# Altium footprint library Connector_Samtec_HLE_SMD.PcbLib: 290 footprints (part 6 of 24)
Each footprint in its own frame and in the unit in brackets; x right, y up, seen from the top. Pads: shape width x height; smd on the part's side, far side on the other; paste and mask are expansions set on the pad; w line width, h text height; cw(c..) or ccw(c..) is an arc to the next point about the centre after c.
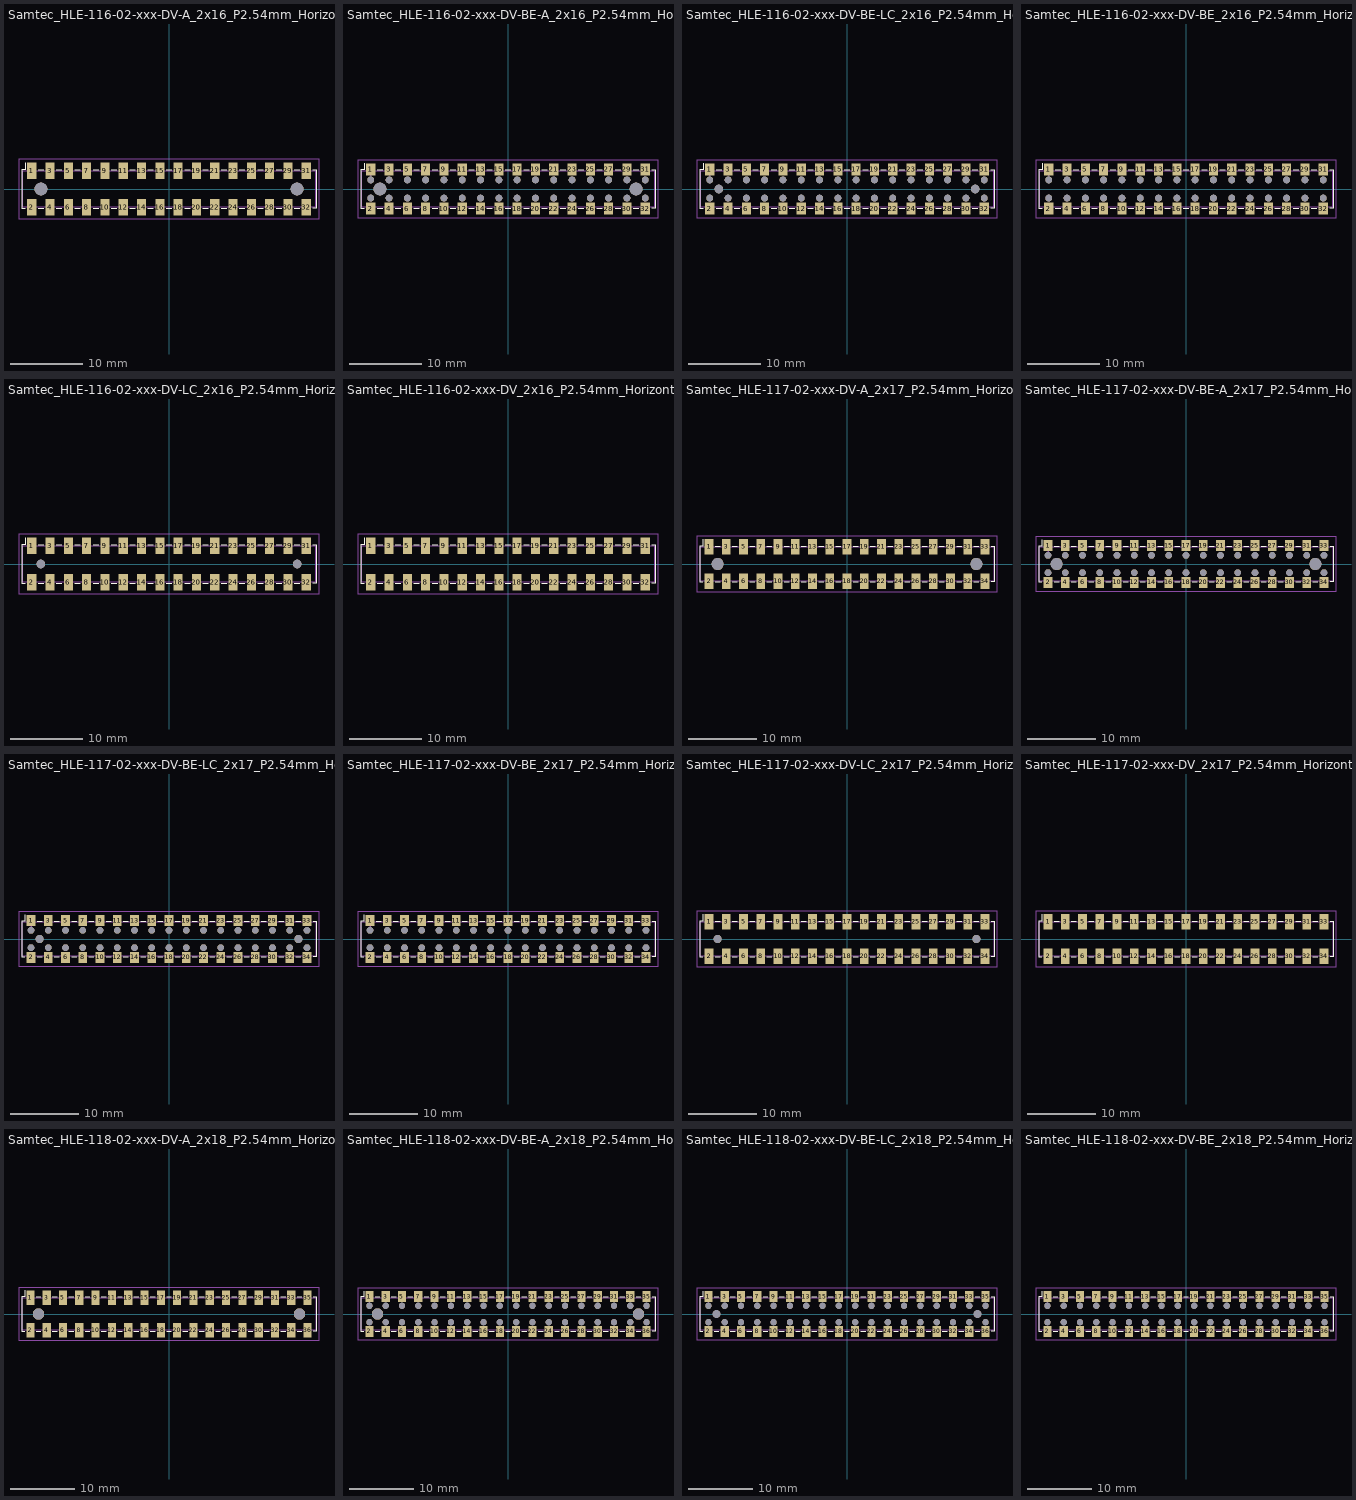
[diagram p5: the footprints below, top view; thin cyan lines are the x and y axes]

## Samtec_HLE-116-02-xxx-DV-A_2x16_P2.54mm_Horizontal [mm]
pads (34):
  rect 1.27x2.29 smd: 1(-19.05,2.525) 2(-19.05,-2.525) 3(-16.51,2.525) 4(-16.51,-2.525) 5(-13.97,2.525) 6(-13.97,-2.525) 7(-11.43,2.525) 8(-11.43,-2.525) 9(-8.89,2.525) 10(-8.89,-2.525) 11(-6.35,2.525) 12(-6.35,-2.525) 13(-3.81,2.525) 14(-3.81,-2.525) 15(-1.27,2.525) 16(-1.27,-2.525) 17(1.27,2.525) 18(1.27,-2.525) 19(3.81,2.525) 20(3.81,-2.525) 21(6.35,2.525) 22(6.35,-2.525) 23(8.89,2.525) 24(8.89,-2.525) 25(11.43,2.525) 26(11.43,-2.525) 27(13.97,2.525) 28(13.97,-2.525) 29(16.51,2.525) 30(16.51,-2.525) 31(19.05,2.525) 32(19.05,-2.525)
  round 1.78 hole 1.78: Un1(-17.78,0) Un2(17.78,0)
F.SilkS:
  lines w0.12: -19.945,-2.65 -20.43,-2.65 -20.43,2.65 -19.945,2.65 -19.945,3.67 ; -18.155,-2.65 -17.405,-2.65 ; -18.155,2.65 -17.405,2.65 ; -15.615,-2.65 -14.865,-2.65 ; -15.615,2.65 -14.865,2.65 ; -13.075,-2.65 -12.325,-2.65 ; -13.075,2.65 -12.325,2.65 ; -10.535,-2.65 -9.785,-2.65 ; -10.535,2.65 -9.785,2.65 ; -7.995,-2.65 -7.245,-2.65 ; -7.995,2.65 -7.245,2.65 ; -5.455,-2.65 -4.705,-2.65 ; -5.455,2.65 -4.705,2.65 ; -2.915,-2.65 -2.165,-2.65 ; -2.915,2.65 -2.165,2.65 ; -0.375,-2.65 0.375,-2.65 ; -0.375,2.65 0.375,2.65 ; 2.165,-2.65 2.915,-2.65 ; 2.165,2.65 2.915,2.65 ; 4.705,-2.65 5.455,-2.65 ; 4.705,2.65 5.455,2.65 ; 7.245,-2.65 7.995,-2.65 ; 7.245,2.65 7.995,2.65 ; 9.785,-2.65 10.535,-2.65 ; 9.785,2.65 10.535,2.65 ; 12.325,-2.65 13.075,-2.65 ; 12.325,2.65 13.075,2.65 ; 14.865,-2.65 15.615,-2.65 ; 14.865,2.65 15.615,2.65 ; 17.405,-2.65 18.155,-2.65 ; 17.405,2.65 18.155,2.65 ; 19.945,-2.65 20.43,-2.65 20.43,2.65 19.945,2.65
F.CrtYd:
  lines w0.05: -20.82,-4.17 20.82,-4.17 20.82,4.17 -20.82,4.17 -20.82,-4.17
F.Fab:
  lines w0.1: -19.55,2.54 -19.05,1.833 -18.55,2.54 ; -20.32,-2.54 -20.32,2.54 20.32,2.54 20.32,-2.54 -20.32,-2.54
  text "'.Designator'" at -4.047,-2.68 h1

## Samtec_HLE-116-02-xxx-DV-BE-A_2x16_P2.54mm_Horizontal [mm]
pads (66):
  rect 1.27x1.68 smd: 1(-19.05,2.72) 2(-19.05,-2.72) 3(-16.51,2.72) 4(-16.51,-2.72) 5(-13.97,2.72) 6(-13.97,-2.72) 7(-11.43,2.72) 8(-11.43,-2.72) 9(-8.89,2.72) 10(-8.89,-2.72) 11(-6.35,2.72) 12(-6.35,-2.72) 13(-3.81,2.72) 14(-3.81,-2.72) 15(-1.27,2.72) 16(-1.27,-2.72) 17(1.27,2.72) 18(1.27,-2.72) 19(3.81,2.72) 20(3.81,-2.72) 21(6.35,2.72) 22(6.35,-2.72) 23(8.89,2.72) 24(8.89,-2.72) 25(11.43,2.72) 26(11.43,-2.72) 27(13.97,2.72) 28(13.97,-2.72) 29(16.51,2.72) 30(16.51,-2.72) 31(19.05,2.72) 32(19.05,-2.72)
  round 0.97 hole 0.97: Un1(11.43,-1.27) Un3(13.97,1.27) Un4(1.27,-1.27) Un5(6.35,1.27) Un7(-1.27,-1.27) Un8(3.81,1.27) Un9(-1.27,1.27) Un10(16.51,-1.27) Un11(-19.05,1.27) Un12(3.81,-1.27) Un13(6.35,-1.27) Un14(-3.81,-1.27) Un15(-16.51,1.27) Un16(-11.43,1.27) Un17(-19.05,-1.27) Un18(1.27,1.27) Un19(19.05,1.27) Un20(-6.35,-1.27) Un21(8.89,-1.27) Un22(11.43,1.27) Un23(-8.89,1.27) Un24(-3.81,1.27) Un25(-6.35,1.27) Un26(-16.51,-1.27) Un27(-11.43,-1.27) Un28(-13.97,-1.27) Un29(-13.97,1.27) Un30(8.89,1.27) Un31(13.97,-1.27) Un32(19.05,-1.27) Un33(16.51,1.27) Un34(-8.89,-1.27)
  round 1.78 hole 1.78: Un2(-17.78,0) Un6(17.78,0)
F.SilkS:
  lines w0.12: -19.945,-2.65 -20.43,-2.65 -20.43,2.65 -19.945,2.65 -19.945,3.56 ; -18.155,-2.65 -17.405,-2.65 ; -18.155,2.65 -17.405,2.65 ; -15.615,-2.65 -14.865,-2.65 ; -15.615,2.65 -14.865,2.65 ; -13.075,-2.65 -12.325,-2.65 ; -13.075,2.65 -12.325,2.65 ; -10.535,-2.65 -9.785,-2.65 ; -10.535,2.65 -9.785,2.65 ; -7.995,-2.65 -7.245,-2.65 ; -7.995,2.65 -7.245,2.65 ; -5.455,-2.65 -4.705,-2.65 ; -5.455,2.65 -4.705,2.65 ; -2.915,-2.65 -2.165,-2.65 ; -2.915,2.65 -2.165,2.65 ; -0.375,-2.65 0.375,-2.65 ; -0.375,2.65 0.375,2.65 ; 2.165,-2.65 2.915,-2.65 ; 2.165,2.65 2.915,2.65 ; 4.705,-2.65 5.455,-2.65 ; 4.705,2.65 5.455,2.65 ; 7.245,-2.65 7.995,-2.65 ; 7.245,2.65 7.995,2.65 ; 9.785,-2.65 10.535,-2.65 ; 9.785,2.65 10.535,2.65 ; 12.325,-2.65 13.075,-2.65 ; 12.325,2.65 13.075,2.65 ; 14.865,-2.65 15.615,-2.65 ; 14.865,2.65 15.615,2.65 ; 17.405,-2.65 18.155,-2.65 ; 17.405,2.65 18.155,2.65 ; 19.945,-2.65 20.43,-2.65 20.43,2.65 19.945,2.65
F.CrtYd:
  lines w0.05: -20.82,-4.06 20.82,-4.06 20.82,4.06 -20.82,4.06 -20.82,-4.06
F.Fab:
  lines w0.1: -19.55,2.54 -19.05,1.833 -18.55,2.54 ; -20.32,-2.54 -20.32,2.54 20.32,2.54 20.32,-2.54 -20.32,-2.54
  text "'.Designator'" at -4.047,-2.68 h1

## Samtec_HLE-116-02-xxx-DV-BE-LC_2x16_P2.54mm_Horizontal [mm]
pads (66):
  rect 1.27x1.68 smd: 1(-19.05,2.72) 2(-19.05,-2.72) 3(-16.51,2.72) 4(-16.51,-2.72) 5(-13.97,2.72) 6(-13.97,-2.72) 7(-11.43,2.72) 8(-11.43,-2.72) 9(-8.89,2.72) 10(-8.89,-2.72) 11(-6.35,2.72) 12(-6.35,-2.72) 13(-3.81,2.72) 14(-3.81,-2.72) 15(-1.27,2.72) 16(-1.27,-2.72) 17(1.27,2.72) 18(1.27,-2.72) 19(3.81,2.72) 20(3.81,-2.72) 21(6.35,2.72) 22(6.35,-2.72) 23(8.89,2.72) 24(8.89,-2.72) 25(11.43,2.72) 26(11.43,-2.72) 27(13.97,2.72) 28(13.97,-2.72) 29(16.51,2.72) 30(16.51,-2.72) 31(19.05,2.72) 32(19.05,-2.72)
  round 0.97 hole 0.97: Un1(-1.27,-1.27) Un2(-3.81,-1.27) Un3(16.51,-1.27) Un4(6.35,-1.27) Un5(-8.89,-1.27) Un6(13.97,1.27) Un7(6.35,1.27) Un8(11.43,1.27) Un10(1.27,-1.27) Un11(1.27,1.27) Un12(8.89,-1.27) Un13(16.51,1.27) Un14(-19.05,1.27) Un15(-6.35,1.27) Un16(11.43,-1.27) Un17(13.97,-1.27) Un18(3.81,1.27) Un19(-16.51,-1.27) Un20(-13.97,-1.27) Un21(-16.51,1.27) Un22(8.89,1.27) Un23(19.05,1.27) Un24(-8.89,1.27) Un25(-11.43,1.27) Un26(-6.35,-1.27) Un27(-1.27,1.27) Un28(3.81,-1.27) Un30(19.05,-1.27) Un31(-11.43,-1.27) Un32(-13.97,1.27) Un33(-3.81,1.27) Un34(-19.05,-1.27)
  round 1.19 hole 1.19: Un9(-17.78,0) Un29(17.78,0)
F.SilkS:
  lines w0.12: -19.945,-2.65 -20.43,-2.65 -20.43,2.65 -19.945,2.65 -19.945,3.56 ; -18.155,-2.65 -17.405,-2.65 ; -18.155,2.65 -17.405,2.65 ; -15.615,-2.65 -14.865,-2.65 ; -15.615,2.65 -14.865,2.65 ; -13.075,-2.65 -12.325,-2.65 ; -13.075,2.65 -12.325,2.65 ; -10.535,-2.65 -9.785,-2.65 ; -10.535,2.65 -9.785,2.65 ; -7.995,-2.65 -7.245,-2.65 ; -7.995,2.65 -7.245,2.65 ; -5.455,-2.65 -4.705,-2.65 ; -5.455,2.65 -4.705,2.65 ; -2.915,-2.65 -2.165,-2.65 ; -2.915,2.65 -2.165,2.65 ; -0.375,-2.65 0.375,-2.65 ; -0.375,2.65 0.375,2.65 ; 2.165,-2.65 2.915,-2.65 ; 2.165,2.65 2.915,2.65 ; 4.705,-2.65 5.455,-2.65 ; 4.705,2.65 5.455,2.65 ; 7.245,-2.65 7.995,-2.65 ; 7.245,2.65 7.995,2.65 ; 9.785,-2.65 10.535,-2.65 ; 9.785,2.65 10.535,2.65 ; 12.325,-2.65 13.075,-2.65 ; 12.325,2.65 13.075,2.65 ; 14.865,-2.65 15.615,-2.65 ; 14.865,2.65 15.615,2.65 ; 17.405,-2.65 18.155,-2.65 ; 17.405,2.65 18.155,2.65 ; 19.945,-2.65 20.43,-2.65 20.43,2.65 19.945,2.65
F.CrtYd:
  lines w0.05: -20.82,-4.06 20.82,-4.06 20.82,4.06 -20.82,4.06 -20.82,-4.06
F.Fab:
  lines w0.1: -19.55,2.54 -19.05,1.833 -18.55,2.54 ; -20.32,-2.54 -20.32,2.54 20.32,2.54 20.32,-2.54 -20.32,-2.54
  text "'.Designator'" at -4.047,-2.68 h1

## Samtec_HLE-116-02-xxx-DV-BE_2x16_P2.54mm_Horizontal [mm]
pads (64):
  rect 1.27x1.68 smd: 1(-19.05,2.72) 2(-19.05,-2.72) 3(-16.51,2.72) 4(-16.51,-2.72) 5(-13.97,2.72) 6(-13.97,-2.72) 7(-11.43,2.72) 8(-11.43,-2.72) 9(-8.89,2.72) 10(-8.89,-2.72) 11(-6.35,2.72) 12(-6.35,-2.72) 13(-3.81,2.72) 14(-3.81,-2.72) 15(-1.27,2.72) 16(-1.27,-2.72) 17(1.27,2.72) 18(1.27,-2.72) 19(3.81,2.72) 20(3.81,-2.72) 21(6.35,2.72) 22(6.35,-2.72) 23(8.89,2.72) 24(8.89,-2.72) 25(11.43,2.72) 26(11.43,-2.72) 27(13.97,2.72) 28(13.97,-2.72) 29(16.51,2.72) 30(16.51,-2.72) 31(19.05,2.72) 32(19.05,-2.72)
  round 0.97 hole 0.97: Un1(-13.97,1.27) Un2(-1.27,-1.27) Un3(8.89,1.27) Un4(11.43,1.27) Un5(6.35,1.27) Un6(3.81,1.27) Un7(-3.81,-1.27) Un8(1.27,-1.27) Un9(-19.05,-1.27) Un10(-11.43,-1.27) Un11(-16.51,-1.27) Un12(19.05,1.27) Un13(-6.35,-1.27) Un14(1.27,1.27) Un15(8.89,-1.27) Un16(13.97,-1.27) Un17(6.35,-1.27) Un18(11.43,-1.27) Un19(-6.35,1.27) Un20(19.05,-1.27) Un21(-19.05,1.27) Un22(-8.89,-1.27) Un23(-3.81,1.27) Un24(16.51,1.27) Un25(-1.27,1.27) Un26(-16.51,1.27) Un27(-11.43,1.27) Un28(-8.89,1.27) Un29(3.81,-1.27) Un30(13.97,1.27) Un31(16.51,-1.27) Un32(-13.97,-1.27)
F.SilkS:
  lines w0.12: -19.945,-2.65 -20.43,-2.65 -20.43,2.65 -19.945,2.65 -19.945,3.56 ; -18.155,-2.65 -17.405,-2.65 ; -18.155,2.65 -17.405,2.65 ; -15.615,-2.65 -14.865,-2.65 ; -15.615,2.65 -14.865,2.65 ; -13.075,-2.65 -12.325,-2.65 ; -13.075,2.65 -12.325,2.65 ; -10.535,-2.65 -9.785,-2.65 ; -10.535,2.65 -9.785,2.65 ; -7.995,-2.65 -7.245,-2.65 ; -7.995,2.65 -7.245,2.65 ; -5.455,-2.65 -4.705,-2.65 ; -5.455,2.65 -4.705,2.65 ; -2.915,-2.65 -2.165,-2.65 ; -2.915,2.65 -2.165,2.65 ; -0.375,-2.65 0.375,-2.65 ; -0.375,2.65 0.375,2.65 ; 2.165,-2.65 2.915,-2.65 ; 2.165,2.65 2.915,2.65 ; 4.705,-2.65 5.455,-2.65 ; 4.705,2.65 5.455,2.65 ; 7.245,-2.65 7.995,-2.65 ; 7.245,2.65 7.995,2.65 ; 9.785,-2.65 10.535,-2.65 ; 9.785,2.65 10.535,2.65 ; 12.325,-2.65 13.075,-2.65 ; 12.325,2.65 13.075,2.65 ; 14.865,-2.65 15.615,-2.65 ; 14.865,2.65 15.615,2.65 ; 17.405,-2.65 18.155,-2.65 ; 17.405,2.65 18.155,2.65 ; 19.945,-2.65 20.43,-2.65 20.43,2.65 19.945,2.65
F.CrtYd:
  lines w0.05: -20.82,-4.06 20.82,-4.06 20.82,4.06 -20.82,4.06 -20.82,-4.06
F.Fab:
  lines w0.1: -19.55,2.54 -19.05,1.833 -18.55,2.54 ; -20.32,-2.54 -20.32,2.54 20.32,2.54 20.32,-2.54 -20.32,-2.54
  text "'.Designator'" at -4.047,-2.68 h1

## Samtec_HLE-116-02-xxx-DV-LC_2x16_P2.54mm_Horizontal [mm]
pads (34):
  rect 1.27x2.29 smd: 1(-19.05,2.525) 2(-19.05,-2.525) 3(-16.51,2.525) 4(-16.51,-2.525) 5(-13.97,2.525) 6(-13.97,-2.525) 7(-11.43,2.525) 8(-11.43,-2.525) 9(-8.89,2.525) 10(-8.89,-2.525) 11(-6.35,2.525) 12(-6.35,-2.525) 13(-3.81,2.525) 14(-3.81,-2.525) 15(-1.27,2.525) 16(-1.27,-2.525) 17(1.27,2.525) 18(1.27,-2.525) 19(3.81,2.525) 20(3.81,-2.525) 21(6.35,2.525) 22(6.35,-2.525) 23(8.89,2.525) 24(8.89,-2.525) 25(11.43,2.525) 26(11.43,-2.525) 27(13.97,2.525) 28(13.97,-2.525) 29(16.51,2.525) 30(16.51,-2.525) 31(19.05,2.525) 32(19.05,-2.525)
  round 1.19 hole 1.19: Un1(17.78,0) Un2(-17.78,0)
F.SilkS:
  lines w0.12: -19.945,-2.65 -20.43,-2.65 -20.43,2.65 -19.945,2.65 -19.945,3.67 ; -18.155,-2.65 -17.405,-2.65 ; -18.155,2.65 -17.405,2.65 ; -15.615,-2.65 -14.865,-2.65 ; -15.615,2.65 -14.865,2.65 ; -13.075,-2.65 -12.325,-2.65 ; -13.075,2.65 -12.325,2.65 ; -10.535,-2.65 -9.785,-2.65 ; -10.535,2.65 -9.785,2.65 ; -7.995,-2.65 -7.245,-2.65 ; -7.995,2.65 -7.245,2.65 ; -5.455,-2.65 -4.705,-2.65 ; -5.455,2.65 -4.705,2.65 ; -2.915,-2.65 -2.165,-2.65 ; -2.915,2.65 -2.165,2.65 ; -0.375,-2.65 0.375,-2.65 ; -0.375,2.65 0.375,2.65 ; 2.165,-2.65 2.915,-2.65 ; 2.165,2.65 2.915,2.65 ; 4.705,-2.65 5.455,-2.65 ; 4.705,2.65 5.455,2.65 ; 7.245,-2.65 7.995,-2.65 ; 7.245,2.65 7.995,2.65 ; 9.785,-2.65 10.535,-2.65 ; 9.785,2.65 10.535,2.65 ; 12.325,-2.65 13.075,-2.65 ; 12.325,2.65 13.075,2.65 ; 14.865,-2.65 15.615,-2.65 ; 14.865,2.65 15.615,2.65 ; 17.405,-2.65 18.155,-2.65 ; 17.405,2.65 18.155,2.65 ; 19.945,-2.65 20.43,-2.65 20.43,2.65 19.945,2.65
F.CrtYd:
  lines w0.05: -20.82,-4.17 20.82,-4.17 20.82,4.17 -20.82,4.17 -20.82,-4.17
F.Fab:
  lines w0.1: -19.55,2.54 -19.05,1.833 -18.55,2.54 ; -20.32,-2.54 20.32,-2.54 20.32,2.54 -20.32,2.54 -20.32,-2.54
  text "'.Designator'" at -4.047,-2.68 h1

## Samtec_HLE-116-02-xxx-DV_2x16_P2.54mm_Horizontal [mm]
pads (32):
  rect 1.27x2.29 smd: 1(-19.05,2.525) 2(-19.05,-2.525) 3(-16.51,2.525) 4(-16.51,-2.525) 5(-13.97,2.525) 6(-13.97,-2.525) 7(-11.43,2.525) 8(-11.43,-2.525) 9(-8.89,2.525) 10(-8.89,-2.525) 11(-6.35,2.525) 12(-6.35,-2.525) 13(-3.81,2.525) 14(-3.81,-2.525) 15(-1.27,2.525) 16(-1.27,-2.525) 17(1.27,2.525) 18(1.27,-2.525) 19(3.81,2.525) 20(3.81,-2.525) 21(6.35,2.525) 22(6.35,-2.525) 23(8.89,2.525) 24(8.89,-2.525) 25(11.43,2.525) 26(11.43,-2.525) 27(13.97,2.525) 28(13.97,-2.525) 29(16.51,2.525) 30(16.51,-2.525) 31(19.05,2.525) 32(19.05,-2.525)
F.SilkS:
  lines w0.12: -19.945,-2.65 -20.43,-2.65 -20.43,2.65 -19.945,2.65 -19.945,3.67 ; -18.155,-2.65 -17.405,-2.65 ; -18.155,2.65 -17.405,2.65 ; -15.615,-2.65 -14.865,-2.65 ; -15.615,2.65 -14.865,2.65 ; -13.075,-2.65 -12.325,-2.65 ; -13.075,2.65 -12.325,2.65 ; -10.535,-2.65 -9.785,-2.65 ; -10.535,2.65 -9.785,2.65 ; -7.995,-2.65 -7.245,-2.65 ; -7.995,2.65 -7.245,2.65 ; -5.455,-2.65 -4.705,-2.65 ; -5.455,2.65 -4.705,2.65 ; -2.915,-2.65 -2.165,-2.65 ; -2.915,2.65 -2.165,2.65 ; -0.375,-2.65 0.375,-2.65 ; -0.375,2.65 0.375,2.65 ; 2.165,-2.65 2.915,-2.65 ; 2.165,2.65 2.915,2.65 ; 4.705,-2.65 5.455,-2.65 ; 4.705,2.65 5.455,2.65 ; 7.245,-2.65 7.995,-2.65 ; 7.245,2.65 7.995,2.65 ; 9.785,-2.65 10.535,-2.65 ; 9.785,2.65 10.535,2.65 ; 12.325,-2.65 13.075,-2.65 ; 12.325,2.65 13.075,2.65 ; 14.865,-2.65 15.615,-2.65 ; 14.865,2.65 15.615,2.65 ; 17.405,-2.65 18.155,-2.65 ; 17.405,2.65 18.155,2.65 ; 19.945,-2.65 20.43,-2.65 20.43,2.65 19.945,2.65
F.CrtYd:
  lines w0.05: -20.82,-4.17 -20.82,4.17 20.82,4.17 20.82,-4.17 -20.82,-4.17
F.Fab:
  lines w0.1: -19.55,2.54 -19.05,1.833 -18.55,2.54 ; -20.32,-2.54 -20.32,2.54 20.32,2.54 20.32,-2.54 -20.32,-2.54
  text "'.Designator'" at -4.047,-2.68 h1

## Samtec_HLE-117-02-xxx-DV-A_2x17_P2.54mm_Horizontal [mm]
pads (36):
  rect 1.27x2.29 smd: 1(-20.32,2.525) 2(-20.32,-2.525) 3(-17.78,2.525) 4(-17.78,-2.525) 5(-15.24,2.525) 6(-15.24,-2.525) 7(-12.7,2.525) 8(-12.7,-2.525) 9(-10.16,2.525) 10(-10.16,-2.525) 11(-7.62,2.525) 12(-7.62,-2.525) 13(-5.08,2.525) 14(-5.08,-2.525) 15(-2.54,2.525) 16(-2.54,-2.525) 17(0,2.525) 18(0,-2.525) 19(2.54,2.525) 20(2.54,-2.525) 21(5.08,2.525) 22(5.08,-2.525) 23(7.62,2.525) 24(7.62,-2.525) 25(10.16,2.525) 26(10.16,-2.525) 27(12.7,2.525) 28(12.7,-2.525) 29(15.24,2.525) 30(15.24,-2.525) 31(17.78,2.525) 32(17.78,-2.525) 33(20.32,2.525) 34(20.32,-2.525)
  round 1.78 hole 1.78: Un1(19.05,0) Un2(-19.05,0)
F.SilkS:
  lines w0.12: -21.215,-2.65 -21.7,-2.65 -21.7,2.65 -21.215,2.65 -21.215,3.67 ; -19.425,-2.65 -18.675,-2.65 ; -19.425,2.65 -18.675,2.65 ; -16.885,-2.65 -16.135,-2.65 ; -16.885,2.65 -16.135,2.65 ; -14.345,-2.65 -13.595,-2.65 ; -14.345,2.65 -13.595,2.65 ; -11.805,-2.65 -11.055,-2.65 ; -11.805,2.65 -11.055,2.65 ; -9.265,-2.65 -8.515,-2.65 ; -9.265,2.65 -8.515,2.65 ; -6.725,-2.65 -5.975,-2.65 ; -6.725,2.65 -5.975,2.65 ; -4.185,-2.65 -3.435,-2.65 ; -4.185,2.65 -3.435,2.65 ; -1.645,-2.65 -0.895,-2.65 ; -1.645,2.65 -0.895,2.65 ; 0.895,-2.65 1.645,-2.65 ; 0.895,2.65 1.645,2.65 ; 3.435,-2.65 4.185,-2.65 ; 3.435,2.65 4.185,2.65 ; 5.975,-2.65 6.725,-2.65 ; 5.975,2.65 6.725,2.65 ; 8.515,-2.65 9.265,-2.65 ; 8.515,2.65 9.265,2.65 ; 11.055,-2.65 11.805,-2.65 ; 11.055,2.65 11.805,2.65 ; 13.595,-2.65 14.345,-2.65 ; 13.595,2.65 14.345,2.65 ; 16.135,-2.65 16.885,-2.65 ; 16.135,2.65 16.885,2.65 ; 18.675,-2.65 19.425,-2.65 ; 18.675,2.65 19.425,2.65 ; 21.215,-2.65 21.7,-2.65 21.7,2.65 21.215,2.65
F.CrtYd:
  lines w0.05: -22.09,-4.17 -22.09,4.17 22.09,4.17 22.09,-4.17 -22.09,-4.17
F.Fab:
  lines w0.1: -20.82,2.54 -20.32,1.833 -19.82,2.54 ; -21.59,-2.54 -21.59,2.54 21.59,2.54 21.59,-2.54 -21.59,-2.54
  text "'.Designator'" at -4.047,-2.68 h1

## Samtec_HLE-117-02-xxx-DV-BE-A_2x17_P2.54mm_Horizontal [mm]
pads (70):
  rect 1.27x1.68 smd: 1(-20.32,2.72) 2(-20.32,-2.72) 3(-17.78,2.72) 4(-17.78,-2.72) 5(-15.24,2.72) 6(-15.24,-2.72) 7(-12.7,2.72) 8(-12.7,-2.72) 9(-10.16,2.72) 10(-10.16,-2.72) 11(-7.62,2.72) 12(-7.62,-2.72) 13(-5.08,2.72) 14(-5.08,-2.72) 15(-2.54,2.72) 16(-2.54,-2.72) 17(0,2.72) 18(0,-2.72) 19(2.54,2.72) 20(2.54,-2.72) 21(5.08,2.72) 22(5.08,-2.72) 23(7.62,2.72) 24(7.62,-2.72) 25(10.16,2.72) 26(10.16,-2.72) 27(12.7,2.72) 28(12.7,-2.72) 29(15.24,2.72) 30(15.24,-2.72) 31(17.78,2.72) 32(17.78,-2.72) 33(20.32,2.72) 34(20.32,-2.72)
  round 0.97 hole 0.97: Un1(-20.32,-1.27) Un2(12.7,-1.27) Un3(-2.54,1.27) Un4(5.08,-1.27) Un5(10.16,-1.27) Un6(20.32,1.27) Un7(-20.32,1.27) Un9(-17.78,-1.27) Un10(-2.54,-1.27) Un11(15.24,1.27) Un12(20.32,-1.27) Un13(7.62,-1.27) Un14(17.78,1.27) Un15(12.7,1.27) Un16(-5.08,-1.27) Un17(-15.24,-1.27) Un18(-12.7,1.27) Un19(-10.16,1.27) Un20(10.16,1.27) Un21(0,1.27) Un22(-17.78,1.27) Un23(0,-1.27) Un24(2.54,-1.27) Un25(17.78,-1.27) Un26(-12.7,-1.27) Un27(-7.62,-1.27) Un28(15.24,-1.27) Un29(-15.24,1.27) Un30(-5.08,1.27) Un31(5.08,1.27) Un32(7.62,1.27) Un34(-10.16,-1.27) Un35(2.54,1.27) Un36(-7.62,1.27)
  round 1.78 hole 1.78: Un8(-19.05,0) Un33(19.05,0)
F.SilkS:
  lines w0.12: -21.215,-2.65 -21.7,-2.65 -21.7,2.65 -21.215,2.65 -21.215,3.56 ; -19.425,-2.65 -18.675,-2.65 ; -19.425,2.65 -18.675,2.65 ; -16.885,-2.65 -16.135,-2.65 ; -16.885,2.65 -16.135,2.65 ; -14.345,-2.65 -13.595,-2.65 ; -14.345,2.65 -13.595,2.65 ; -11.805,-2.65 -11.055,-2.65 ; -11.805,2.65 -11.055,2.65 ; -9.265,-2.65 -8.515,-2.65 ; -9.265,2.65 -8.515,2.65 ; -6.725,-2.65 -5.975,-2.65 ; -6.725,2.65 -5.975,2.65 ; -4.185,-2.65 -3.435,-2.65 ; -4.185,2.65 -3.435,2.65 ; -1.645,-2.65 -0.895,-2.65 ; -1.645,2.65 -0.895,2.65 ; 0.895,-2.65 1.645,-2.65 ; 0.895,2.65 1.645,2.65 ; 3.435,-2.65 4.185,-2.65 ; 3.435,2.65 4.185,2.65 ; 5.975,-2.65 6.725,-2.65 ; 5.975,2.65 6.725,2.65 ; 8.515,-2.65 9.265,-2.65 ; 8.515,2.65 9.265,2.65 ; 11.055,-2.65 11.805,-2.65 ; 11.055,2.65 11.805,2.65 ; 13.595,-2.65 14.345,-2.65 ; 13.595,2.65 14.345,2.65 ; 16.135,-2.65 16.885,-2.65 ; 16.135,2.65 16.885,2.65 ; 18.675,-2.65 19.425,-2.65 ; 18.675,2.65 19.425,2.65 ; 21.215,-2.65 21.7,-2.65 21.7,2.65 21.215,2.65
F.CrtYd:
  lines w0.05: -22.09,-4.06 22.09,-4.06 22.09,4.06 -22.09,4.06 -22.09,-4.06
F.Fab:
  lines w0.1: -20.82,2.54 -20.32,1.833 -19.82,2.54 ; -21.59,-2.54 21.59,-2.54 21.59,2.54 -21.59,2.54 -21.59,-2.54
  text "'.Designator'" at -4.047,-2.68 h1

## Samtec_HLE-117-02-xxx-DV-BE-LC_2x17_P2.54mm_Horizontal [mm]
pads (70):
  rect 1.27x1.68 smd: 1(-20.32,2.72) 2(-20.32,-2.72) 3(-17.78,2.72) 4(-17.78,-2.72) 5(-15.24,2.72) 6(-15.24,-2.72) 7(-12.7,2.72) 8(-12.7,-2.72) 9(-10.16,2.72) 10(-10.16,-2.72) 11(-7.62,2.72) 12(-7.62,-2.72) 13(-5.08,2.72) 14(-5.08,-2.72) 15(-2.54,2.72) 16(-2.54,-2.72) 17(0,2.72) 18(0,-2.72) 19(2.54,2.72) 20(2.54,-2.72) 21(5.08,2.72) 22(5.08,-2.72) 23(7.62,2.72) 24(7.62,-2.72) 25(10.16,2.72) 26(10.16,-2.72) 27(12.7,2.72) 28(12.7,-2.72) 29(15.24,2.72) 30(15.24,-2.72) 31(17.78,2.72) 32(17.78,-2.72) 33(20.32,2.72) 34(20.32,-2.72)
  round 0.97 hole 0.97: Un1(-10.16,-1.27) Un3(-12.7,1.27) Un5(-2.54,1.27) Un6(-15.24,1.27) Un7(2.54,-1.27) Un8(17.78,-1.27) Un9(2.54,1.27) Un10(-10.16,1.27) Un11(-2.54,-1.27) Un12(12.7,-1.27) Un13(5.08,1.27) Un14(-5.08,-1.27) Un15(20.32,1.27) Un16(20.32,-1.27) Un17(0,1.27) Un18(-7.62,1.27) Un19(-17.78,1.27) Un20(17.78,1.27) Un21(12.7,1.27) Un22(-7.62,-1.27) Un23(0,-1.27) Un24(-12.7,-1.27) Un25(-5.08,1.27) Un26(5.08,-1.27) Un27(-17.78,-1.27) Un28(-20.32,1.27) Un29(10.16,1.27) Un30(-20.32,-1.27) Un31(10.16,-1.27) Un32(15.24,1.27) Un33(7.62,-1.27) Un34(-15.24,-1.27) Un35(15.24,-1.27) Un36(7.62,1.27)
  round 1.19 hole 1.19: Un2(19.05,0) Un4(-19.05,0)
F.SilkS:
  lines w0.12: -21.215,-2.65 -21.7,-2.65 -21.7,2.65 -21.215,2.65 -21.215,3.56 ; -19.425,-2.65 -18.675,-2.65 ; -19.425,2.65 -18.675,2.65 ; -16.885,-2.65 -16.135,-2.65 ; -16.885,2.65 -16.135,2.65 ; -14.345,-2.65 -13.595,-2.65 ; -14.345,2.65 -13.595,2.65 ; -11.805,-2.65 -11.055,-2.65 ; -11.805,2.65 -11.055,2.65 ; -9.265,-2.65 -8.515,-2.65 ; -9.265,2.65 -8.515,2.65 ; -6.725,-2.65 -5.975,-2.65 ; -6.725,2.65 -5.975,2.65 ; -4.185,-2.65 -3.435,-2.65 ; -4.185,2.65 -3.435,2.65 ; -1.645,-2.65 -0.895,-2.65 ; -1.645,2.65 -0.895,2.65 ; 0.895,-2.65 1.645,-2.65 ; 0.895,2.65 1.645,2.65 ; 3.435,-2.65 4.185,-2.65 ; 3.435,2.65 4.185,2.65 ; 5.975,-2.65 6.725,-2.65 ; 5.975,2.65 6.725,2.65 ; 8.515,-2.65 9.265,-2.65 ; 8.515,2.65 9.265,2.65 ; 11.055,-2.65 11.805,-2.65 ; 11.055,2.65 11.805,2.65 ; 13.595,-2.65 14.345,-2.65 ; 13.595,2.65 14.345,2.65 ; 16.135,-2.65 16.885,-2.65 ; 16.135,2.65 16.885,2.65 ; 18.675,-2.65 19.425,-2.65 ; 18.675,2.65 19.425,2.65 ; 21.215,-2.65 21.7,-2.65 21.7,2.65 21.215,2.65
F.CrtYd:
  lines w0.05: -22.09,-4.06 -22.09,4.06 22.09,4.06 22.09,-4.06 -22.09,-4.06
F.Fab:
  lines w0.1: -20.82,2.54 -20.32,1.833 -19.82,2.54 ; -21.59,-2.54 21.59,-2.54 21.59,2.54 -21.59,2.54 -21.59,-2.54
  text "'.Designator'" at -4.047,-2.68 h1

## Samtec_HLE-117-02-xxx-DV-BE_2x17_P2.54mm_Horizontal [mm]
pads (68):
  rect 1.27x1.68 smd: 1(-20.32,2.72) 2(-20.32,-2.72) 3(-17.78,2.72) 4(-17.78,-2.72) 5(-15.24,2.72) 6(-15.24,-2.72) 7(-12.7,2.72) 8(-12.7,-2.72) 9(-10.16,2.72) 10(-10.16,-2.72) 11(-7.62,2.72) 12(-7.62,-2.72) 13(-5.08,2.72) 14(-5.08,-2.72) 15(-2.54,2.72) 16(-2.54,-2.72) 17(0,2.72) 18(0,-2.72) 19(2.54,2.72) 20(2.54,-2.72) 21(5.08,2.72) 22(5.08,-2.72) 23(7.62,2.72) 24(7.62,-2.72) 25(10.16,2.72) 26(10.16,-2.72) 27(12.7,2.72) 28(12.7,-2.72) 29(15.24,2.72) 30(15.24,-2.72) 31(17.78,2.72) 32(17.78,-2.72) 33(20.32,2.72) 34(20.32,-2.72)
  round 0.97 hole 0.97: Un1(2.54,-1.27) Un2(-17.78,1.27) Un3(-12.7,-1.27) Un4(7.62,1.27) Un5(20.32,1.27) Un6(-15.24,-1.27) Un7(7.62,-1.27) Un8(5.08,-1.27) Un9(-2.54,1.27) Un10(-17.78,-1.27) Un11(12.7,1.27) Un12(15.24,-1.27) Un13(2.54,1.27) Un14(-5.08,1.27) Un15(-7.62,-1.27) Un16(20.32,-1.27) Un17(10.16,-1.27) Un18(17.78,-1.27) Un19(-20.32,-1.27) Un20(0,1.27) Un21(12.7,-1.27) Un22(-2.54,-1.27) Un23(-5.08,-1.27) Un24(-7.62,1.27) Un25(10.16,1.27) Un26(-12.7,1.27) Un27(-10.16,-1.27) Un28(0,-1.27) Un29(17.78,1.27) Un30(5.08,1.27) Un31(-20.32,1.27) Un32(-10.16,1.27) Un33(15.24,1.27) Un34(-15.24,1.27)
F.SilkS:
  lines w0.12: -21.215,-2.65 -21.7,-2.65 -21.7,2.65 -21.215,2.65 -21.215,3.56 ; -19.425,-2.65 -18.675,-2.65 ; -19.425,2.65 -18.675,2.65 ; -16.885,-2.65 -16.135,-2.65 ; -16.885,2.65 -16.135,2.65 ; -14.345,-2.65 -13.595,-2.65 ; -14.345,2.65 -13.595,2.65 ; -11.805,-2.65 -11.055,-2.65 ; -11.805,2.65 -11.055,2.65 ; -9.265,-2.65 -8.515,-2.65 ; -9.265,2.65 -8.515,2.65 ; -6.725,-2.65 -5.975,-2.65 ; -6.725,2.65 -5.975,2.65 ; -4.185,-2.65 -3.435,-2.65 ; -4.185,2.65 -3.435,2.65 ; -1.645,-2.65 -0.895,-2.65 ; -1.645,2.65 -0.895,2.65 ; 0.895,-2.65 1.645,-2.65 ; 0.895,2.65 1.645,2.65 ; 3.435,-2.65 4.185,-2.65 ; 3.435,2.65 4.185,2.65 ; 5.975,-2.65 6.725,-2.65 ; 5.975,2.65 6.725,2.65 ; 8.515,-2.65 9.265,-2.65 ; 8.515,2.65 9.265,2.65 ; 11.055,-2.65 11.805,-2.65 ; 11.055,2.65 11.805,2.65 ; 13.595,-2.65 14.345,-2.65 ; 13.595,2.65 14.345,2.65 ; 16.135,-2.65 16.885,-2.65 ; 16.135,2.65 16.885,2.65 ; 18.675,-2.65 19.425,-2.65 ; 18.675,2.65 19.425,2.65 ; 21.215,-2.65 21.7,-2.65 21.7,2.65 21.215,2.65
F.CrtYd:
  lines w0.05: -22.09,-4.06 22.09,-4.06 22.09,4.06 -22.09,4.06 -22.09,-4.06
F.Fab:
  lines w0.1: -20.82,2.54 -20.32,1.833 -19.82,2.54 ; -21.59,-2.54 21.59,-2.54 21.59,2.54 -21.59,2.54 -21.59,-2.54
  text "'.Designator'" at -4.047,-2.68 h1

## Samtec_HLE-117-02-xxx-DV-LC_2x17_P2.54mm_Horizontal [mm]
pads (36):
  rect 1.27x2.29 smd: 1(-20.32,2.525) 2(-20.32,-2.525) 3(-17.78,2.525) 4(-17.78,-2.525) 5(-15.24,2.525) 6(-15.24,-2.525) 7(-12.7,2.525) 8(-12.7,-2.525) 9(-10.16,2.525) 10(-10.16,-2.525) 11(-7.62,2.525) 12(-7.62,-2.525) 13(-5.08,2.525) 14(-5.08,-2.525) 15(-2.54,2.525) 16(-2.54,-2.525) 17(0,2.525) 18(0,-2.525) 19(2.54,2.525) 20(2.54,-2.525) 21(5.08,2.525) 22(5.08,-2.525) 23(7.62,2.525) 24(7.62,-2.525) 25(10.16,2.525) 26(10.16,-2.525) 27(12.7,2.525) 28(12.7,-2.525) 29(15.24,2.525) 30(15.24,-2.525) 31(17.78,2.525) 32(17.78,-2.525) 33(20.32,2.525) 34(20.32,-2.525)
  round 1.19 hole 1.19: Un1(19.05,0) Un2(-19.05,0)
F.SilkS:
  lines w0.12: -21.215,-2.65 -21.7,-2.65 -21.7,2.65 -21.215,2.65 -21.215,3.67 ; -19.425,-2.65 -18.675,-2.65 ; -19.425,2.65 -18.675,2.65 ; -16.885,-2.65 -16.135,-2.65 ; -16.885,2.65 -16.135,2.65 ; -14.345,-2.65 -13.595,-2.65 ; -14.345,2.65 -13.595,2.65 ; -11.805,-2.65 -11.055,-2.65 ; -11.805,2.65 -11.055,2.65 ; -9.265,-2.65 -8.515,-2.65 ; -9.265,2.65 -8.515,2.65 ; -6.725,-2.65 -5.975,-2.65 ; -6.725,2.65 -5.975,2.65 ; -4.185,-2.65 -3.435,-2.65 ; -4.185,2.65 -3.435,2.65 ; -1.645,-2.65 -0.895,-2.65 ; -1.645,2.65 -0.895,2.65 ; 0.895,-2.65 1.645,-2.65 ; 0.895,2.65 1.645,2.65 ; 3.435,-2.65 4.185,-2.65 ; 3.435,2.65 4.185,2.65 ; 5.975,-2.65 6.725,-2.65 ; 5.975,2.65 6.725,2.65 ; 8.515,-2.65 9.265,-2.65 ; 8.515,2.65 9.265,2.65 ; 11.055,-2.65 11.805,-2.65 ; 11.055,2.65 11.805,2.65 ; 13.595,-2.65 14.345,-2.65 ; 13.595,2.65 14.345,2.65 ; 16.135,-2.65 16.885,-2.65 ; 16.135,2.65 16.885,2.65 ; 18.675,-2.65 19.425,-2.65 ; 18.675,2.65 19.425,2.65 ; 21.215,-2.65 21.7,-2.65 21.7,2.65 21.215,2.65
F.CrtYd:
  lines w0.05: -22.09,-4.17 -22.09,4.17 22.09,4.17 22.09,-4.17 -22.09,-4.17
F.Fab:
  lines w0.1: -20.82,2.54 -20.32,1.833 -19.82,2.54 ; -21.59,-2.54 21.59,-2.54 21.59,2.54 -21.59,2.54 -21.59,-2.54
  text "'.Designator'" at -4.047,-2.68 h1

## Samtec_HLE-117-02-xxx-DV_2x17_P2.54mm_Horizontal [mm]
pads (34):
  rect 1.27x2.29 smd: 1(-20.32,2.525) 2(-20.32,-2.525) 3(-17.78,2.525) 4(-17.78,-2.525) 5(-15.24,2.525) 6(-15.24,-2.525) 7(-12.7,2.525) 8(-12.7,-2.525) 9(-10.16,2.525) 10(-10.16,-2.525) 11(-7.62,2.525) 12(-7.62,-2.525) 13(-5.08,2.525) 14(-5.08,-2.525) 15(-2.54,2.525) 16(-2.54,-2.525) 17(0,2.525) 18(0,-2.525) 19(2.54,2.525) 20(2.54,-2.525) 21(5.08,2.525) 22(5.08,-2.525) 23(7.62,2.525) 24(7.62,-2.525) 25(10.16,2.525) 26(10.16,-2.525) 27(12.7,2.525) 28(12.7,-2.525) 29(15.24,2.525) 30(15.24,-2.525) 31(17.78,2.525) 32(17.78,-2.525) 33(20.32,2.525) 34(20.32,-2.525)
F.SilkS:
  lines w0.12: -21.215,-2.65 -21.7,-2.65 -21.7,2.65 -21.215,2.65 -21.215,3.67 ; -19.425,-2.65 -18.675,-2.65 ; -19.425,2.65 -18.675,2.65 ; -16.885,-2.65 -16.135,-2.65 ; -16.885,2.65 -16.135,2.65 ; -14.345,-2.65 -13.595,-2.65 ; -14.345,2.65 -13.595,2.65 ; -11.805,-2.65 -11.055,-2.65 ; -11.805,2.65 -11.055,2.65 ; -9.265,-2.65 -8.515,-2.65 ; -9.265,2.65 -8.515,2.65 ; -6.725,-2.65 -5.975,-2.65 ; -6.725,2.65 -5.975,2.65 ; -4.185,-2.65 -3.435,-2.65 ; -4.185,2.65 -3.435,2.65 ; -1.645,-2.65 -0.895,-2.65 ; -1.645,2.65 -0.895,2.65 ; 0.895,-2.65 1.645,-2.65 ; 0.895,2.65 1.645,2.65 ; 3.435,-2.65 4.185,-2.65 ; 3.435,2.65 4.185,2.65 ; 5.975,-2.65 6.725,-2.65 ; 5.975,2.65 6.725,2.65 ; 8.515,-2.65 9.265,-2.65 ; 8.515,2.65 9.265,2.65 ; 11.055,-2.65 11.805,-2.65 ; 11.055,2.65 11.805,2.65 ; 13.595,-2.65 14.345,-2.65 ; 13.595,2.65 14.345,2.65 ; 16.135,-2.65 16.885,-2.65 ; 16.135,2.65 16.885,2.65 ; 18.675,-2.65 19.425,-2.65 ; 18.675,2.65 19.425,2.65 ; 21.215,-2.65 21.7,-2.65 21.7,2.65 21.215,2.65
F.CrtYd:
  lines w0.05: -22.09,-4.17 22.09,-4.17 22.09,4.17 -22.09,4.17 -22.09,-4.17
F.Fab:
  lines w0.1: -20.82,2.54 -20.32,1.833 -19.82,2.54 ; -21.59,-2.54 -21.59,2.54 21.59,2.54 21.59,-2.54 -21.59,-2.54
  text "'.Designator'" at -4.047,-2.68 h1

## Samtec_HLE-118-02-xxx-DV-A_2x18_P2.54mm_Horizontal [mm]
pads (38):
  rect 1.27x2.29 smd: 1(-21.59,2.525) 2(-21.59,-2.525) 3(-19.05,2.525) 4(-19.05,-2.525) 5(-16.51,2.525) 6(-16.51,-2.525) 7(-13.97,2.525) 8(-13.97,-2.525) 9(-11.43,2.525) 10(-11.43,-2.525) 11(-8.89,2.525) 12(-8.89,-2.525) 13(-6.35,2.525) 14(-6.35,-2.525) 15(-3.81,2.525) 16(-3.81,-2.525) 17(-1.27,2.525) 18(-1.27,-2.525) 19(1.27,2.525) 20(1.27,-2.525) 21(3.81,2.525) 22(3.81,-2.525) 23(6.35,2.525) 24(6.35,-2.525) 25(8.89,2.525) 26(8.89,-2.525) 27(11.43,2.525) 28(11.43,-2.525) 29(13.97,2.525) 30(13.97,-2.525) 31(16.51,2.525) 32(16.51,-2.525) 33(19.05,2.525) 34(19.05,-2.525) 35(21.59,2.525) 36(21.59,-2.525)
  round 1.78 hole 1.78: Un1(-20.32,0) Un2(20.32,0)
F.SilkS:
  lines w0.12: -22.485,-2.65 -22.97,-2.65 -22.97,2.65 -22.485,2.65 -22.485,3.67 ; -20.695,-2.65 -19.945,-2.65 ; -20.695,2.65 -19.945,2.65 ; -18.155,-2.65 -17.405,-2.65 ; -18.155,2.65 -17.405,2.65 ; -15.615,-2.65 -14.865,-2.65 ; -15.615,2.65 -14.865,2.65 ; -13.075,-2.65 -12.325,-2.65 ; -13.075,2.65 -12.325,2.65 ; -10.535,-2.65 -9.785,-2.65 ; -10.535,2.65 -9.785,2.65 ; -7.995,-2.65 -7.245,-2.65 ; -7.995,2.65 -7.245,2.65 ; -5.455,-2.65 -4.705,-2.65 ; -5.455,2.65 -4.705,2.65 ; -2.915,-2.65 -2.165,-2.65 ; -2.915,2.65 -2.165,2.65 ; -0.375,-2.65 0.375,-2.65 ; -0.375,2.65 0.375,2.65 ; 2.165,-2.65 2.915,-2.65 ; 2.165,2.65 2.915,2.65 ; 4.705,-2.65 5.455,-2.65 ; 4.705,2.65 5.455,2.65 ; 7.245,-2.65 7.995,-2.65 ; 7.245,2.65 7.995,2.65 ; 9.785,-2.65 10.535,-2.65 ; 9.785,2.65 10.535,2.65 ; 12.325,-2.65 13.075,-2.65 ; 12.325,2.65 13.075,2.65 ; 14.865,-2.65 15.615,-2.65 ; 14.865,2.65 15.615,2.65 ; 17.405,-2.65 18.155,-2.65 ; 17.405,2.65 18.155,2.65 ; 19.945,-2.65 20.695,-2.65 ; 19.945,2.65 20.695,2.65 ; 22.485,-2.65 22.97,-2.65 22.97,2.65 22.485,2.65
F.CrtYd:
  lines w0.05: -23.36,-4.17 -23.36,4.17 23.36,4.17 23.36,-4.17 -23.36,-4.17
F.Fab:
  lines w0.1: -22.09,2.54 -21.59,1.833 -21.09,2.54 ; -22.86,-2.54 22.86,-2.54 22.86,2.54 -22.86,2.54 -22.86,-2.54
  text "'.Designator'" at -4.047,-2.68 h1

## Samtec_HLE-118-02-xxx-DV-BE-A_2x18_P2.54mm_Horizontal [mm]
pads (74):
  rect 1.27x1.68 smd: 1(-21.59,2.72) 2(-21.59,-2.72) 3(-19.05,2.72) 4(-19.05,-2.72) 5(-16.51,2.72) 6(-16.51,-2.72) 7(-13.97,2.72) 8(-13.97,-2.72) 9(-11.43,2.72) 10(-11.43,-2.72) 11(-8.89,2.72) 12(-8.89,-2.72) 13(-6.35,2.72) 14(-6.35,-2.72) 15(-3.81,2.72) 16(-3.81,-2.72) 17(-1.27,2.72) 18(-1.27,-2.72) 19(1.27,2.72) 20(1.27,-2.72) 21(3.81,2.72) 22(3.81,-2.72) 23(6.35,2.72) 24(6.35,-2.72) 25(8.89,2.72) 26(8.89,-2.72) 27(11.43,2.72) 28(11.43,-2.72) 29(13.97,2.72) 30(13.97,-2.72) 31(16.51,2.72) 32(16.51,-2.72) 33(19.05,2.72) 34(19.05,-2.72) 35(21.59,2.72) 36(21.59,-2.72)
  round 0.97 hole 0.97: Un1(-13.97,1.27) Un2(-19.05,1.27) Un3(6.35,-1.27) Un4(8.89,1.27) Un5(3.81,-1.27) Un6(11.43,-1.27) Un7(1.27,-1.27) Un8(11.43,1.27) Un10(-16.51,-1.27) Un11(8.89,-1.27) Un12(-1.27,1.27) Un13(-6.35,-1.27) Un14(13.97,-1.27) Un15(-11.43,-1.27) Un16(16.51,-1.27) Un17(-3.81,1.27) Un18(-21.59,1.27) Un19(-16.51,1.27) Un20(-8.89,-1.27) Un21(-19.05,-1.27) Un22(21.59,1.27) Un23(-6.35,1.27) Un24(1.27,1.27) Un25(-11.43,1.27) Un26(6.35,1.27) Un27(19.05,-1.27) Un28(-3.81,-1.27) Un29(3.81,1.27) Un30(-21.59,-1.27) Un31(16.51,1.27) Un33(-8.89,1.27) Un34(19.05,1.27) Un35(21.59,-1.27) Un36(-13.97,-1.27) Un37(13.97,1.27) Un38(-1.27,-1.27)
  round 1.78 hole 1.78: Un9(20.32,0) Un32(-20.32,0)
F.SilkS:
  lines w0.12: -22.485,-2.65 -22.97,-2.65 -22.97,2.65 -22.485,2.65 -22.485,3.56 ; -20.695,-2.65 -19.945,-2.65 ; -20.695,2.65 -19.945,2.65 ; -18.155,-2.65 -17.405,-2.65 ; -18.155,2.65 -17.405,2.65 ; -15.615,-2.65 -14.865,-2.65 ; -15.615,2.65 -14.865,2.65 ; -13.075,-2.65 -12.325,-2.65 ; -13.075,2.65 -12.325,2.65 ; -10.535,-2.65 -9.785,-2.65 ; -10.535,2.65 -9.785,2.65 ; -7.995,-2.65 -7.245,-2.65 ; -7.995,2.65 -7.245,2.65 ; -5.455,-2.65 -4.705,-2.65 ; -5.455,2.65 -4.705,2.65 ; -2.915,-2.65 -2.165,-2.65 ; -2.915,2.65 -2.165,2.65 ; -0.375,-2.65 0.375,-2.65 ; -0.375,2.65 0.375,2.65 ; 2.165,-2.65 2.915,-2.65 ; 2.165,2.65 2.915,2.65 ; 4.705,-2.65 5.455,-2.65 ; 4.705,2.65 5.455,2.65 ; 7.245,-2.65 7.995,-2.65 ; 7.245,2.65 7.995,2.65 ; 9.785,-2.65 10.535,-2.65 ; 9.785,2.65 10.535,2.65 ; 12.325,-2.65 13.075,-2.65 ; 12.325,2.65 13.075,2.65 ; 14.865,-2.65 15.615,-2.65 ; 14.865,2.65 15.615,2.65 ; 17.405,-2.65 18.155,-2.65 ; 17.405,2.65 18.155,2.65 ; 19.945,-2.65 20.695,-2.65 ; 19.945,2.65 20.695,2.65 ; 22.485,-2.65 22.97,-2.65 22.97,2.65 22.485,2.65
F.CrtYd:
  lines w0.05: -23.36,-4.06 -23.36,4.06 23.36,4.06 23.36,-4.06 -23.36,-4.06
F.Fab:
  lines w0.1: -22.09,2.54 -21.59,1.833 -21.09,2.54 ; -22.86,-2.54 -22.86,2.54 22.86,2.54 22.86,-2.54 -22.86,-2.54
  text "'.Designator'" at -4.047,-2.68 h1

## Samtec_HLE-118-02-xxx-DV-BE-LC_2x18_P2.54mm_Horizontal [mm]
pads (74):
  rect 1.27x1.68 smd: 1(-21.59,2.72) 2(-21.59,-2.72) 3(-19.05,2.72) 4(-19.05,-2.72) 5(-16.51,2.72) 6(-16.51,-2.72) 7(-13.97,2.72) 8(-13.97,-2.72) 9(-11.43,2.72) 10(-11.43,-2.72) 11(-8.89,2.72) 12(-8.89,-2.72) 13(-6.35,2.72) 14(-6.35,-2.72) 15(-3.81,2.72) 16(-3.81,-2.72) 17(-1.27,2.72) 18(-1.27,-2.72) 19(1.27,2.72) 20(1.27,-2.72) 21(3.81,2.72) 22(3.81,-2.72) 23(6.35,2.72) 24(6.35,-2.72) 25(8.89,2.72) 26(8.89,-2.72) 27(11.43,2.72) 28(11.43,-2.72) 29(13.97,2.72) 30(13.97,-2.72) 31(16.51,2.72) 32(16.51,-2.72) 33(19.05,2.72) 34(19.05,-2.72) 35(21.59,2.72) 36(21.59,-2.72)
  round 0.97 hole 0.97: Un1(-19.05,-1.27) Un2(-1.27,-1.27) Un3(-8.89,1.27) Un4(-21.59,1.27) Un5(-16.51,1.27) Un6(11.43,1.27) Un8(6.35,1.27) Un9(-13.97,-1.27) Un10(-8.89,-1.27) Un11(11.43,-1.27) Un12(21.59,-1.27) Un13(3.81,-1.27) Un15(16.51,1.27) Un16(6.35,-1.27) Un17(-13.97,1.27) Un18(-16.51,-1.27) Un19(19.05,1.27) Un20(21.59,1.27) Un21(8.89,1.27) Un22(16.51,-1.27) Un23(1.27,1.27) Un24(-6.35,1.27) Un25(-6.35,-1.27) Un26(-3.81,1.27) Un27(-3.81,-1.27) Un28(8.89,-1.27) Un29(13.97,-1.27) Un30(-11.43,1.27) Un31(13.97,1.27) Un32(-1.27,1.27) Un33(1.27,-1.27) Un34(19.05,-1.27) Un35(-11.43,-1.27) Un36(-19.05,1.27) Un37(-21.59,-1.27) Un38(3.81,1.27)
  round 1.19 hole 1.19: Un7(20.32,0) Un14(-20.32,0)
F.SilkS:
  lines w0.12: -22.485,-2.65 -22.97,-2.65 -22.97,2.65 -22.485,2.65 -22.485,3.56 ; -20.695,-2.65 -19.945,-2.65 ; -20.695,2.65 -19.945,2.65 ; -18.155,-2.65 -17.405,-2.65 ; -18.155,2.65 -17.405,2.65 ; -15.615,-2.65 -14.865,-2.65 ; -15.615,2.65 -14.865,2.65 ; -13.075,-2.65 -12.325,-2.65 ; -13.075,2.65 -12.325,2.65 ; -10.535,-2.65 -9.785,-2.65 ; -10.535,2.65 -9.785,2.65 ; -7.995,-2.65 -7.245,-2.65 ; -7.995,2.65 -7.245,2.65 ; -5.455,-2.65 -4.705,-2.65 ; -5.455,2.65 -4.705,2.65 ; -2.915,-2.65 -2.165,-2.65 ; -2.915,2.65 -2.165,2.65 ; -0.375,-2.65 0.375,-2.65 ; -0.375,2.65 0.375,2.65 ; 2.165,-2.65 2.915,-2.65 ; 2.165,2.65 2.915,2.65 ; 4.705,-2.65 5.455,-2.65 ; 4.705,2.65 5.455,2.65 ; 7.245,-2.65 7.995,-2.65 ; 7.245,2.65 7.995,2.65 ; 9.785,-2.65 10.535,-2.65 ; 9.785,2.65 10.535,2.65 ; 12.325,-2.65 13.075,-2.65 ; 12.325,2.65 13.075,2.65 ; 14.865,-2.65 15.615,-2.65 ; 14.865,2.65 15.615,2.65 ; 17.405,-2.65 18.155,-2.65 ; 17.405,2.65 18.155,2.65 ; 19.945,-2.65 20.695,-2.65 ; 19.945,2.65 20.695,2.65 ; 22.485,-2.65 22.97,-2.65 22.97,2.65 22.485,2.65
F.CrtYd:
  lines w0.05: -23.36,-4.06 23.36,-4.06 23.36,4.06 -23.36,4.06 -23.36,-4.06
F.Fab:
  lines w0.1: -22.09,2.54 -21.59,1.833 -21.09,2.54 ; -22.86,-2.54 -22.86,2.54 22.86,2.54 22.86,-2.54 -22.86,-2.54
  text "'.Designator'" at -4.047,-2.68 h1

## Samtec_HLE-118-02-xxx-DV-BE_2x18_P2.54mm_Horizontal [mm]
pads (72):
  rect 1.27x1.68 smd: 1(-21.59,2.72) 2(-21.59,-2.72) 3(-19.05,2.72) 4(-19.05,-2.72) 5(-16.51,2.72) 6(-16.51,-2.72) 7(-13.97,2.72) 8(-13.97,-2.72) 9(-11.43,2.72) 10(-11.43,-2.72) 11(-8.89,2.72) 12(-8.89,-2.72) 13(-6.35,2.72) 14(-6.35,-2.72) 15(-3.81,2.72) 16(-3.81,-2.72) 17(-1.27,2.72) 18(-1.27,-2.72) 19(1.27,2.72) 20(1.27,-2.72) 21(3.81,2.72) 22(3.81,-2.72) 23(6.35,2.72) 24(6.35,-2.72) 25(8.89,2.72) 26(8.89,-2.72) 27(11.43,2.72) 28(11.43,-2.72) 29(13.97,2.72) 30(13.97,-2.72) 31(16.51,2.72) 32(16.51,-2.72) 33(19.05,2.72) 34(19.05,-2.72) 35(21.59,2.72) 36(21.59,-2.72)
  round 0.97 hole 0.97: Un1(-21.59,-1.27) Un2(3.81,-1.27) Un3(-3.81,-1.27) Un4(13.97,1.27) Un5(16.51,1.27) Un6(-11.43,-1.27) Un7(-6.35,-1.27) Un8(-1.27,-1.27) Un9(13.97,-1.27) Un10(-16.51,-1.27) Un11(19.05,-1.27) Un12(-1.27,1.27) Un13(-6.35,1.27) Un14(21.59,1.27) Un15(16.51,-1.27) Un16(19.05,1.27) Un17(6.35,-1.27) Un18(-11.43,1.27) Un19(1.27,-1.27) Un20(-13.97,1.27) Un21(-8.89,1.27) Un22(-3.81,1.27) Un23(-21.59,1.27) Un24(-16.51,1.27) Un25(11.43,-1.27) Un26(3.81,1.27) Un27(11.43,1.27) Un28(-19.05,-1.27) Un29(8.89,-1.27) Un30(-8.89,-1.27) Un31(21.59,-1.27) Un32(-13.97,-1.27) Un33(8.89,1.27) Un34(-19.05,1.27) Un35(6.35,1.27) Un36(1.27,1.27)
F.SilkS:
  lines w0.12: -22.485,-2.65 -22.97,-2.65 -22.97,2.65 -22.485,2.65 -22.485,3.56 ; -20.695,-2.65 -19.945,-2.65 ; -20.695,2.65 -19.945,2.65 ; -18.155,-2.65 -17.405,-2.65 ; -18.155,2.65 -17.405,2.65 ; -15.615,-2.65 -14.865,-2.65 ; -15.615,2.65 -14.865,2.65 ; -13.075,-2.65 -12.325,-2.65 ; -13.075,2.65 -12.325,2.65 ; -10.535,-2.65 -9.785,-2.65 ; -10.535,2.65 -9.785,2.65 ; -7.995,-2.65 -7.245,-2.65 ; -7.995,2.65 -7.245,2.65 ; -5.455,-2.65 -4.705,-2.65 ; -5.455,2.65 -4.705,2.65 ; -2.915,-2.65 -2.165,-2.65 ; -2.915,2.65 -2.165,2.65 ; -0.375,-2.65 0.375,-2.65 ; -0.375,2.65 0.375,2.65 ; 2.165,-2.65 2.915,-2.65 ; 2.165,2.65 2.915,2.65 ; 4.705,-2.65 5.455,-2.65 ; 4.705,2.65 5.455,2.65 ; 7.245,-2.65 7.995,-2.65 ; 7.245,2.65 7.995,2.65 ; 9.785,-2.65 10.535,-2.65 ; 9.785,2.65 10.535,2.65 ; 12.325,-2.65 13.075,-2.65 ; 12.325,2.65 13.075,2.65 ; 14.865,-2.65 15.615,-2.65 ; 14.865,2.65 15.615,2.65 ; 17.405,-2.65 18.155,-2.65 ; 17.405,2.65 18.155,2.65 ; 19.945,-2.65 20.695,-2.65 ; 19.945,2.65 20.695,2.65 ; 22.485,-2.65 22.97,-2.65 22.97,2.65 22.485,2.65
F.CrtYd:
  lines w0.05: -23.36,-4.06 23.36,-4.06 23.36,4.06 -23.36,4.06 -23.36,-4.06
F.Fab:
  lines w0.1: -22.09,2.54 -21.59,1.833 -21.09,2.54 ; -22.86,-2.54 -22.86,2.54 22.86,2.54 22.86,-2.54 -22.86,-2.54
  text "'.Designator'" at -4.047,-2.68 h1